# Altium footprint library Herry.PcbLib: 74 footprints (part 5 of 5)
Each footprint in its own frame and in the unit in brackets; x right, y up, seen from the top. Pads: shape width x height; smd on the part's side, far side on the other; paste and mask are expansions set on the pad; w line width, h text height; cw(c..) or ccw(c..) is an arc to the next point about the centre after c.
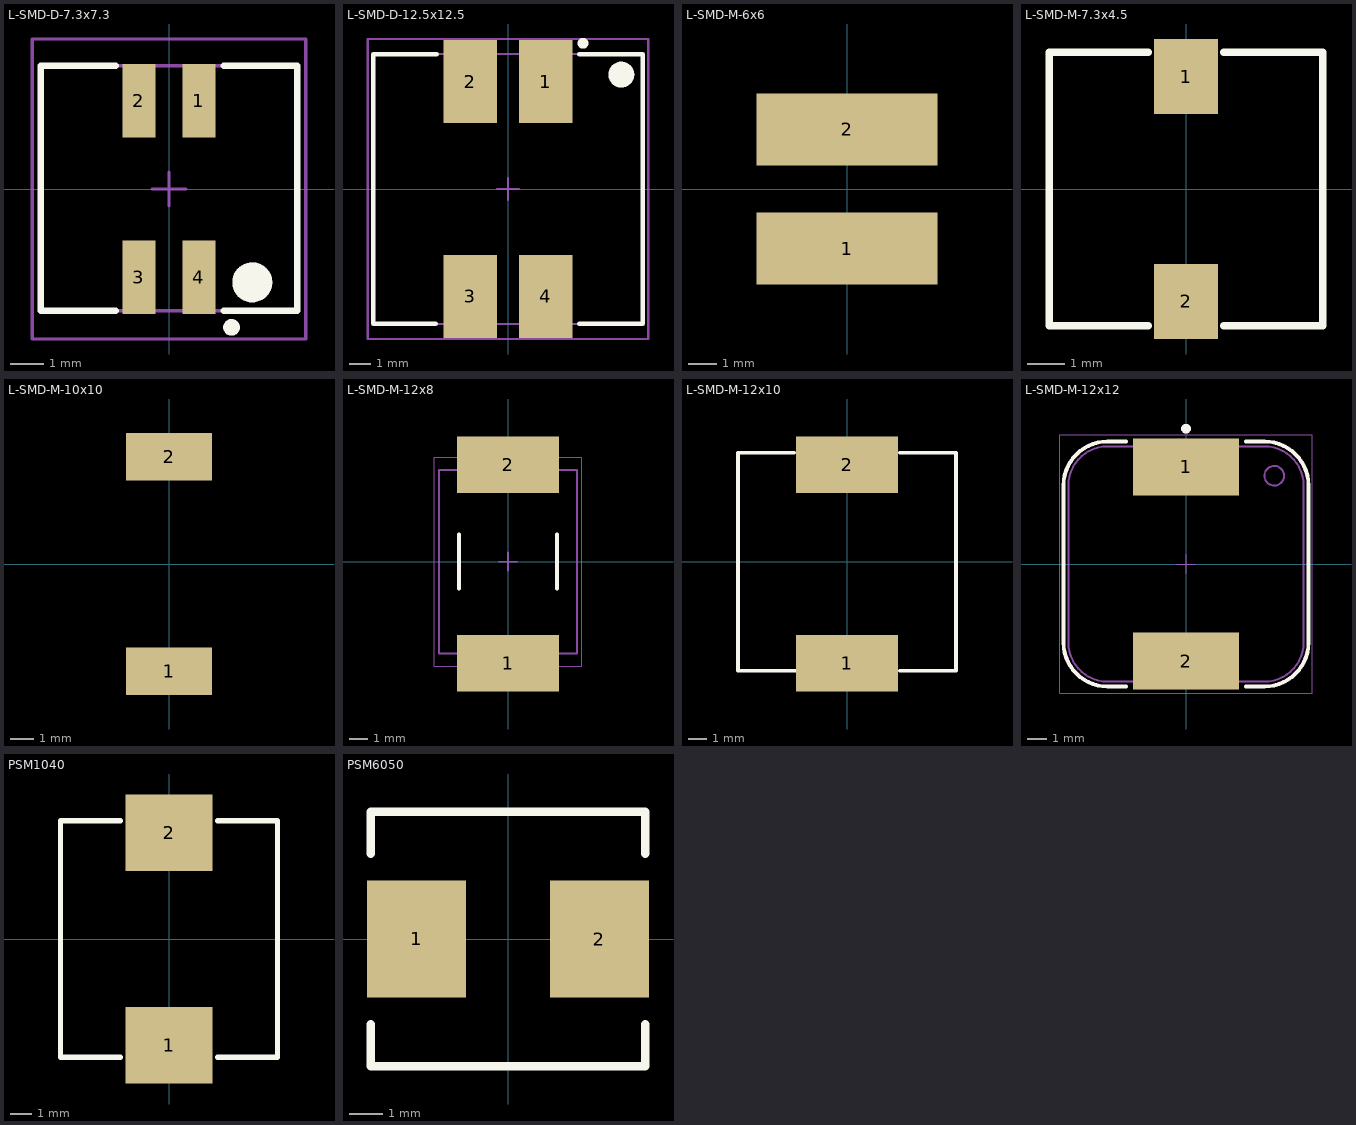
[diagram p4: the footprints below, top view; thin cyan lines are the x and y axes]

## L-SMD-D-7.3x7.3 [mm] "SMD Inductor,  4-Leads, Body 7.3x7.3mm (max)"
height 4.8
pads (4):
  rect 1x2.2 smd: 1(0.9,2.65) 2(-0.9,2.65) 3(-0.9,-2.65) 4(0.9,-2.65)
Top Overlay:
  circle w0.25: c1.875,-4.15 r0.125
  circle w0.6: c2.5,-2.8 r0.3
  lines w0.2: -1.6,-3.65 -3.85,-3.65 -3.85,3.7 -1.6,3.7 ; 1.65,-3.65 3.85,-3.65 3.85,3.65 ; 1.65,3.7 3.85,3.7
Mechanical 13:
  circle w0.1: c2.5,-2.75 r0.5
  lines w0.1: -3.85,-3.65 3.85,-3.65 3.85,3.7 -3.85,3.7 -3.85,-3.65
Mechanical 15:
  lines w0.1: -0.5,0 0.5,0 ; 0,-0.5 0,0.5 ; -4.1,-4.5 4.1,-4.5 4.1,4.5 -4.1,4.5 -4.1,-4.5
3D body "WE-DD_7345_Straight.stp": height 4.76, standoff -0.04, extent -3.65,-3.65 3.65,3.65

## L-SMD-D-12.5x12.5 [mm] "SMD Inductor, 4-Leads, Body 12.5x12.5mm (max)"
height 8.5
pads (4):
  rect 2.5x3.85 smd: 1(1.75,4.975) 2(-1.75,4.975) 3(-1.75,-4.975) 4(1.75,-4.975)
Top Overlay:
  circle w0.6: c5.25,5.3 r0.3
  circle w0.25: c3.475,6.75 r0.125
  lines w0.2: -6.25,-6.25 -6.25,6.25 -3.3,6.25 ; -6.2,-6.25 -3.35,-6.25 ; 3.3,-6.25 6.25,-6.25 6.25,6.25 3.3,6.25
Mechanical 13:
  circle w0.1: c5.3,5.3 r0.5
  lines w0.1: -6.25,-6.25 -6.25,6.25 6.25,6.25 6.25,-6.25 -6.25,-6.25
Mechanical 15:
  lines w0.1: -0.5,0 0.5,0 ; 0,-0.5 0,0.5 ; -6.5,-6.95 -6.5,6.95 6.5,6.95 6.5,-6.95 -6.5,-6.95
3D body "WE-DD_1280_Crossed.stp": height 8.6, standoff 0, extent -6.25,-6.25 6.25,6.25

## L-SMD-M-6x6 [mm]
pads (2):
  rect 6.3x2.5 smd: 1(0,-2.075) 2(0,2.075)
3D body "User Library-CDRH5D28-1.STEP": height 2, standoff 0, extent -3,-3 3.005,3

## L-SMD-M-7.3x4.5 [mm] "WE-PDA SMD Shielded Power Inductor, 7345"
height 4
pads (2):
  rect 1.7x2 smd: 1(0,3) 2(0,-3)
Top Overlay:
  lines w0.2: -1,-3.65 -3.65,-3.65 -3.65,3.65 -1,3.65 ; 1,-3.65 3.65,-3.65 3.65,3.65 1,3.65
3D body "IndPDA_7345.stp": height 4.05, standoff 0.05, extent -3.65,-3.65 3.65,3.65

## L-SMD-M-10x10 [mm]
pads (2):
  rect 3.6x2 smd: 1(0,-4.5) 2(0,4.5)
3D body "User Library-cdrh104r.STEP": height 4, standoff 0, extent -5.125,-5.242 5.175,5.258

## L-SMD-M-12x8 [mm]
height 8
pads (2):
  rect 5.6x3.1 smd: 1(0,-5.588) 2(0,5.334)
Top Overlay:
  lines w0.2: -2.7,-1.5 -2.7,1.5 ; 2.7,-1.5 2.7,1.5
Mechanical 13:
  lines w0.1: -3.8,-5.05 -3.8,5.05 3.8,5.05 3.8,-5.05 -3.8,-5.05
Mechanical 15:
  lines w0.05: -4.05,-5.75 -4.05,5.75 4.05,5.75 4.05,-5.75 -4.05,-5.75
  lines w0.1: -0.5,0 0.5,0 ; 0,-0.5 0,0.5
3D body "100uH_3A.STEP": height 6.9, standoff 0.2, extent -6.096,-6.377 6.404,6.123

## L-SMD-M-12x10 [mm] "WE-PDA SMD Shielded Power Inductor, 1210"
height 10
pads (2):
  rect 5.6x3.1 smd: 1(0,-5.588) 2(0,5.334)
Top Overlay:
  lines w0.2: -2.9,6 -6,6 -6,-6 -2.8,-6 ; 2.9,-6 6,-6 6,6 2.9,6
3D body "IndPDA_1210.stp": height 9.7, standoff 0.04, extent -6,-6 6,6

## L-SMD-M-12x12 [mm] "WE-PDA SMD Shielded Power Inductor, 1212"
height 10
pads (2):
  rect 5.4x2.9 smd: 1(0,4.95) 2(0,-4.95)
Top Overlay:
  circle w0.25: c0,6.9 r0.125
  lines w0.2: -3.05,-6.25 -4,-6.25 cw(c-4,-4) -6.25,-4 -6.25,4 cw(c-4,4) -4,6.25 -3.05,6.25 ; 3.05,-6.25 4,-6.25 ccw(c4,-4) 6.25,-4 6.25,4 ccw(c4,4) 4,6.25 3.05,6.25
Top Courtyard:
  lines w0.05: -0.5,0 0.5,0 ; 0,-0.5 0,0.5 ; -6.45,-6.6 -6.45,6.6 6.45,6.6 6.45,-6.6 -6.45,-6.6
Top 3D Body:
  circle w0.1: c4.5,4.5 r0.5
  lines w0.1: -6,-4 ccw(c-4,-4) -4,-6 4,-6 ccw(c4,-4) 6,-4 6,4 ccw(c4,4) 4,6 -4,6 ccw(c-4,4) -6,4 -6,-4
Top Component Outline:
  circle w0.1: c4.5,4.5 r0.5
  lines w0.1: -6,-4 ccw(c-4,-4) -4,-6 4,-6 ccw(c4,-4) 6,-4 6,4 ccw(c4,4) 4,6 -4,6 ccw(c-4,4) -6,4 -6,-4
3D body "WE-PD_1280_m-base_744770xxx.stp": height 7.51, standoff 0.05, extent -6,-6 6,6

## PSM1040 [mm] "10x10x4mm"
pads (2):
  rect 4.1x3.6 smd: 1(0,-5) 2(0,5)
Top Overlay:
  lines w0.254: -2.286,-5.55 -5.1,-5.55 -5.1,5.55 -2.286,5.55 ; 2.286,-5.55 5.1,-5.55 5.1,5.55 2.286,5.55
3D body "PSM1040 Series SMD Molding inductor.STEP": height 3.9, standoff 0, extent -5.1,-5.55 5.1,5.55

## PSM6050 [mm]
pads (2):
  rect 2.95x3.5 smd: 1(-2.725,0) 2(2.725,0)
Top Overlay:
  lines w0.254: -4.1,-2.54 -4.1,-3.8 4.1,-3.8 4.1,-2.54 ; -4.1,2.54 -4.1,3.8 4.1,3.8 4.1,2.54
3D body "PSM6050 Molded high current inductor.STEP": height 5.01, standoff 0.05, extent -3.6,-3.3 3.6,3.3